# Altium footprint library JL_PCB.PCBLIB: 1129 footprints (part 32 of 72)
Each footprint in its own frame and in the unit in brackets; x right, y up, seen from the top. Pads: shape width x height; smd on the part's side, far side on the other; paste and mask are expansions set on the pad; w line width, h text height; cw(c..) or ccw(c..) is an arc to the next point about the centre after c.
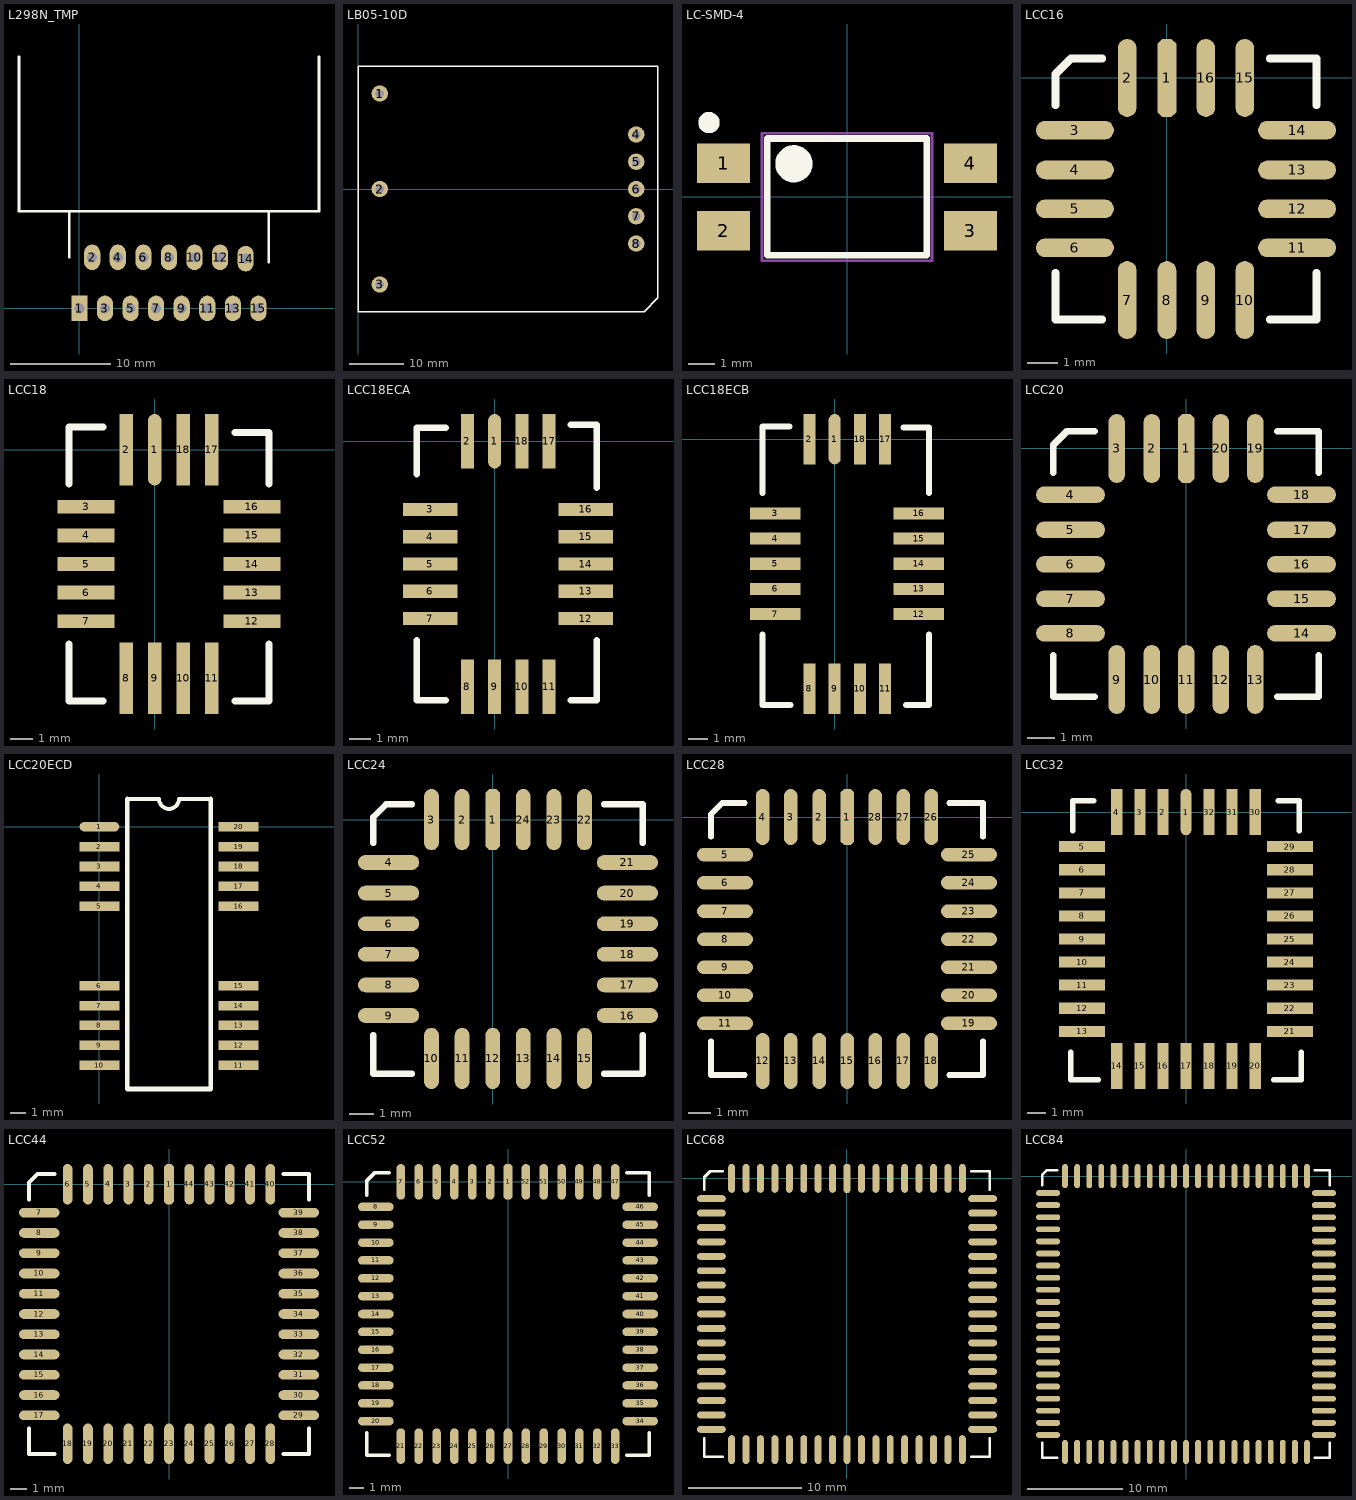
[diagram p31: the footprints below, top view; thin cyan lines are the x and y axes]

## L298N_TMP [mm]
pads (15):
  rect 1.6x2.54 hole 1: 1(0,0)
  oval 1.6x2.54 hole 1: 2(1.27,5.08) 3(2.54,0) 4(3.81,5.08) 5(5.08,0) 6(6.35,5.08) 7(7.62,0) 8(8.89,5.08) 9(10.16,0) 10(11.43,5.08) 11(12.7,0) 12(13.97,5.08) 13(15.24,0) 14(16.51,4.953) 15(17.78,0)
TopOverlay:
  lines w0.254: -6,25 -6,9.652 23.796,9.652 23.796,25 ; -1.016,5.08 -1.016,9.652 ; 18.796,4.572 18.796,9.652

## LB05-10D [mm]
pads (8):
  round 3 hole 1.5: 1(4,17.5) 2(4,0) 3(4,-17.5) 4(51,10) 5(51,5) 6(51,0) 7(51,-5) 8(51,-10)
TopOverlay:
  lines w0.254: 54.991,22.491 54.991,-19.96 52.451,-22.5 0,-22.5 0,22.5 55,22.5

## LC-SMD-4 [mm]
pads (4):
  rect 2x1.5 smd: 1(-4.65,1.27) 2(-4.65,-1.27) 3(4.65,-1.27) 4(4.65,1.27)
TopOverlay:
  circle w0.4: c-5.2,2.8 r0.2
  circle w0.7: c-2,1.25 r0.35
  lines w0.254: -3,-2.2 -3,2.2 3,2.2 3,-2.2 -3,-2.2
Mechanical13:
  lines w0.1: -3.2,-2.4 3.2,-2.4 3.2,2.4 -3.2,2.4 -3.2,-2.4
3D body "User Library-DIP4_opto_iso.STEP": height 3.9, standoff 0, extent -5.015,-2.416 5.015,2.416

## LCC16 [mil]
pads (16):
  oct 24x100 smd: 1(0,0)
  oval 24x100 smd: 2(-51,0) 7(-51,-285) 8(0,-285) 9(50,-285) 10(100,-285) 15(100,0) 16(50,0)
  oval 100x24 smd: 3(-118,-67) 4(-118,-118) 5(-118,-168) 6(-118,-218) 11(167,-218) 12(167,-168) 13(167,-118) 14(167,-67)
TopOverlay:
  lines w10: -143,-250 -143,-310 -83,-310 ; -143,-35 -143,5 -123,25 -83,25 ; 132,-310 192,-310 192,-250 ; 132,25 192,25 192,-35

## LCC18 [mil]
pads (18):
  oval 24x125 smd: 1(0,0)
  rect 24x125 smd: 2(-50,0) 8(-50,-400) 9(0,-400) 10(50,-400) 11(100,-400) 17(100,0) 18(50,0)
  rect 100x24 smd: 3(-120,-100) 4(-120,-150) 5(-120,-200) 6(-120,-250) 7(-120,-300) 12(170,-300) 13(170,-250) 14(170,-200) 15(170,-150) 16(170,-100)
TopOverlay:
  lines w12: -150,-340 -150,-440 -90,-440 ; -150,-60 -150,40 -90,40 ; 140,-440 200,-440 200,-340 ; 140,30 200,30 200,-60

## LCC18ECA [mil]
pads (18):
  oval 24x100 smd: 1(0,0)
  rect 24x100 smd: 2(-50,0) 8(-50,-450) 9(0,-450) 10(50,-450) 11(100,-450) 17(100,0) 18(50,0)
  rect 100x24 smd: 3(-118,-125) 4(-118,-175) 5(-118,-225) 6(-118,-275) 7(-118,-325) 12(167,-325) 13(167,-275) 14(167,-225) 15(167,-175) 16(167,-125)
TopOverlay:
  lines w12: -143,-365 -143,-475 -90,-475 ; -143,-60 -143,25 -90,25 ; 140,-475 187,-475 187,-365 ; 140,30 187,30 187,-85

## LCC18ECB [mil]
pads (18):
  oval 24x100 smd: 1(0,0)
  rect 24x100 smd: 2(-50,0) 8(-50,-495) 9(0,-495) 10(50,-495) 11(100,-495) 17(100,0) 18(50,0)
  rect 100x24 smd: 3(-118,-147) 4(-118,-197) 5(-118,-247) 6(-118,-297) 7(-118,-347) 12(167,-347) 13(167,-297) 14(167,-247) 15(167,-197) 16(167,-147)
TopOverlay:
  lines w12: -143,-387 -143,-527 -88,-527 ; -143,-107 -143,25 -90,25 ; 137,23 187,23 187,-107 ; 142,-527 187,-527 187,-387

## LCC20 [mil]
pads (20):
  oct 24x100 smd: 1(0,0)
  oval 24x100 smd: 2(-50,0) 3(-101,0) 9(-101,-335) 10(-50,-335) 11(0,-335) 12(50,-335) 13(100,-335) 19(100,0) 20(50,0)
  oval 100x24 smd: 4(-168,-67) 5(-168,-118) 6(-168,-168) 7(-168,-218) 8(-168,-268) 14(167,-268) 15(167,-218) 16(167,-168) 17(167,-118) 18(167,-67)
TopOverlay:
  lines w10: -193,-300 -193,-360 -133,-360 ; -193,-35 -193,5 -173,25 -133,25 ; 132,-360 192,-360 192,-300 ; 132,25 192,25 192,-35

## LCC20ECD [mil]
pads (20):
  oval 100x24 smd: 1(0,0)
  rect 100x24 smd: 2(0,-50) 3(0,-100) 4(0,-150) 5(0,-200) 6(0,-400) 7(0,-450) 8(0,-500) 9(0,-550) 10(0,-600) 11(350,-600) 12(350,-550) 13(350,-500) 14(350,-450) 15(350,-400) 16(350,-200) 17(350,-150) 18(350,-100) 19(350,-50) 20(350,0)
TopOverlay:
  lines w10: 70,70 150,70 ccw(c175,70) 200,70 280,70
  lines w12: 70,70 70,-660 280,-660 280,70

## LCC24 [mil]
pads (24):
  oct 24x100 smd: 1(0,0)
  oval 24x100 smd: 2(-50,0) 3(-100,0) 10(-100,-390) 11(-50,-390) 12(0,-390) 13(50,-390) 14(100,-390) 15(150,-390) 22(150,0) 23(100,0) 24(50,0)
  oval 100x24 smd: 4(-170,-70) 5(-170,-120) 6(-170,-170) 7(-170,-220) 8(-170,-270) 9(-170,-320) 16(220,-320) 17(220,-270) 18(220,-220) 19(220,-170) 20(220,-120) 21(220,-70)
TopOverlay:
  lines w10: -195,-352 -195,-415 -132,-415 ; -195,-38 -195,4 -174,25 -132,25 ; 182,-415 245,-415 245,-352 ; 182,25 245,25 245,-38

## LCC28 [mil]
pads (28):
  oct 24x100 smd: 1(0,0)
  oval 24x100 smd: 2(-50,0) 3(-101,0) 4(-151,0) 12(-151,-435) 13(-101,-435) 14(-50,-435) 15(0,-435) 16(50,-435) 17(100,-435) 18(150,-435) 26(150,0) 27(100,0) 28(50,0)
  oval 100x24 smd: 5(-218,-67) 6(-218,-117) 7(-218,-168) 8(-218,-218) 9(-218,-268) 10(-218,-318) 11(-218,-368) 19(217,-368) 20(217,-318) 21(217,-268) 22(217,-218) 23(217,-168) 24(217,-117) 25(217,-67)
TopOverlay:
  lines w10: -243,-400 -243,-460 -183,-460 ; -243,-35 -243,5 -223,25 -183,25 ; 182,-460 242,-460 242,-400 ; 182,25 242,25 242,-35

## LCC32 [mil]
pads (32):
  oval 24x100 smd: 1(0,0)
  rect 24x100 smd: 2(-50,0) 3(-100,0) 4(-150,0) 14(-150,-550) 15(-100,-550) 16(-50,-550) 17(0,-550) 18(50,-550) 19(100,-550) 20(150,-550) 30(150,0) 31(100,0) 32(50,0)
  rect 100x24 smd: 5(-225,-75) 6(-225,-125) 7(-225,-175) 8(-225,-225) 9(-225,-275) 10(-225,-325) 11(-225,-375) 12(-225,-425) 13(-225,-475) 21(225,-475) 22(225,-425) 23(225,-375) 24(225,-325) 25(225,-275) 26(225,-225) 27(225,-175) 28(225,-125) 29(225,-75)
TopOverlay:
  lines w12: -250,-520 -250,-580 -190,-580 ; -245,-40 -245,25 -200,25 ; 190,-580 250,-580 250,-520 ; 200,25 245,25 245,-40

## LCC44 [mil]
pads (44):
  oct 24x100 smd: 1(0,0)
  oval 24x100 smd: 2(-50,0) 3(-100,0) 4(-150,0) 5(-200,0) 6(-250,0) 18(-250,-640) 19(-200,-640) 20(-150,-640) 21(-100,-640) 22(-50,-640) 23(0,-640) 24(50,-640) 25(100,-640) 26(150,-640) 27(200,-640) 28(250,-640) 40(250,0) 41(200,0) 42(150,0) 43(100,0) 44(50,0)
  oval 100x24 smd: 7(-320,-70) 8(-320,-120) 9(-320,-170) 10(-320,-220) 11(-320,-270) 12(-320,-320) 13(-320,-370) 14(-320,-420) 15(-320,-470) 16(-320,-520) 17(-320,-570) 29(320,-570) 30(320,-520) 31(320,-470) 32(320,-420) 33(320,-370) 34(320,-320) 35(320,-270) 36(320,-220) 37(320,-170) 38(320,-120) 39(320,-70)
TopOverlay:
  lines w10: -345,-602 -345,-665 -282,-665 ; -345,-38 -345,4 -324,25 -282,25 ; 282,-665 345,-665 345,-602 ; 282,25 345,25 345,-38

## LCC52 [mil]
pads (52):
  oct 24x100 smd: 1(0,0)
  oval 24x100 smd: 2(-50,0) 3(-100,0) 4(-150,0) 5(-200,0) 6(-250,0) 7(-300,0) 21(-300,-740) 22(-250,-740) 23(-200,-740) 24(-150,-740) 25(-100,-740) 26(-50,-740) 27(0,-740) 28(50,-740) 29(100,-740) 30(150,-740) 31(200,-740) 32(250,-740) 33(300,-740) 47(300,0) 48(250,0) 49(200,0) 50(150,0) 51(100,0) 52(50,0)
  oval 100x24 smd: 8(-370,-70) 9(-370,-120) 10(-370,-170) 11(-370,-220) 12(-370,-270) 13(-370,-320) 14(-370,-370) 15(-370,-420) 16(-370,-470) 17(-370,-520) 18(-370,-570) 19(-370,-620) 20(-370,-670) 34(370,-670) 35(370,-620) 36(370,-570) 37(370,-520) 38(370,-470) 39(370,-420) 40(370,-370) 41(370,-320) 42(370,-270) 43(370,-220) 44(370,-170) 45(370,-120) 46(370,-70)
TopOverlay:
  lines w10: -395,-702 -395,-765 -332,-765 ; -395,-38 -395,4 -374,25 -332,25 ; 332,-765 395,-765 395,-702 ; 332,25 395,25 395,-38

## LCC68 [mil]
pads (68):
  oct 24x100 smd: 1(0,0)
  oval 24x100 smd: 2(-50,0) 3(-100,0) 4(-150,0) 5(-200,0) 6(-250,0) 7(-300,0) 8(-350,0) 9(-400,0) 27(-400,-940) 28(-350,-940) 29(-300,-940) 30(-250,-940) 31(-200,-940) 32(-150,-940) 33(-100,-940) 34(-50,-940) 35(0,-940) 36(50,-940) 37(100,-940) 38(150,-940) 39(200,-940) 40(250,-940) 41(300,-940) 42(350,-940) 43(400,-940) 61(400,0) 62(350,0) 63(300,0) 64(250,0) 65(200,0) 66(150,0) 67(100,0) 68(50,0)
  oval 100x24 smd: 10(-470,-70) 11(-470,-120) 12(-470,-170) 13(-470,-220) 14(-470,-270) 15(-470,-320) 16(-470,-370) 17(-470,-420) 18(-470,-470) 19(-470,-520) 20(-470,-570) 21(-470,-620) 22(-470,-670) 23(-470,-720) 24(-470,-770) 25(-470,-820) 26(-470,-870) 44(470,-870) 45(470,-820) 46(470,-770) 47(470,-720) 48(470,-670) 49(470,-620) 50(470,-570) 51(470,-520) 52(470,-470) 53(470,-420) 54(470,-370) 55(470,-320) 56(470,-270) 57(470,-220) 58(470,-170) 59(470,-120) 60(470,-70)
TopOverlay:
  lines w10: -495,-902 -495,-965 -432,-965 ; -495,-38 -495,4 -474,25 -432,25 ; 432,-965 495,-965 495,-902 ; 432,25 495,25 495,-38

## LCC84 [mil]
pads (84):
  oct 24x100 smd: 1(0,0)
  oval 24x100 smd: 2(-50,0) 3(-100,0) 4(-150,0) 5(-200,0) 6(-250,0) 7(-300,0) 8(-350,0) 9(-400,0) 10(-450,0) 11(-500,0) 33(-500,-1140) 34(-450,-1140) 35(-400,-1140) 36(-350,-1140) 37(-300,-1140) 38(-250,-1140) 39(-200,-1140) 40(-150,-1140) 41(-100,-1140) 42(-50,-1140) 43(0,-1140) 44(50,-1140) 45(100,-1140) 46(150,-1140) 47(200,-1140) 48(250,-1140) 49(300,-1140) 50(350,-1140) 51(400,-1140) 52(450,-1140) 53(500,-1140) 75(500,0) 76(450,0) 77(400,0) 78(350,0) 79(300,0) 80(250,0) 81(200,0) 82(150,0) 83(100,0) 84(50,0)
  oval 100x24 smd: 12(-570,-70) 13(-570,-120) 14(-570,-170) 15(-570,-220) 16(-570,-270) 17(-570,-320) 18(-570,-370) 19(-570,-420) 20(-570,-470) 21(-570,-520) 22(-570,-570) 23(-570,-620) 24(-570,-670) 25(-570,-720) 26(-570,-770) 27(-570,-820) 28(-570,-870) 29(-570,-920) 30(-570,-970) 31(-570,-1020) 32(-570,-1070) 54(570,-1070) 55(570,-1020) 56(570,-970) 57(570,-920) 58(570,-870) 59(570,-820) 60(570,-770) 61(570,-720) 62(570,-670) 63(570,-620) 64(570,-570) 65(570,-520) 66(570,-470) 67(570,-420) 68(570,-370) 69(570,-320) 70(570,-270) 71(570,-220) 72(570,-170) 73(570,-120) 74(570,-70)
TopOverlay:
  lines w10: -595,-1102 -595,-1165 -532,-1165 ; -595,-38 -595,4 -574,25 -532,25 ; 532,-1165 595,-1165 595,-1102 ; 532,25 595,25 595,-38